# Altium footprint library CONN_W2B_JST.PcbLib: 130 footprints (part 9 of 9)
Each footprint in its own frame and in the unit in brackets; x right, y up, seen from the top. Pads: shape width x height; smd on the part's side, far side on the other; paste and mask are expansions set on the pad; w line width, h text height; cw(c..) or ccw(c..) is an arc to the next point about the centre after c.
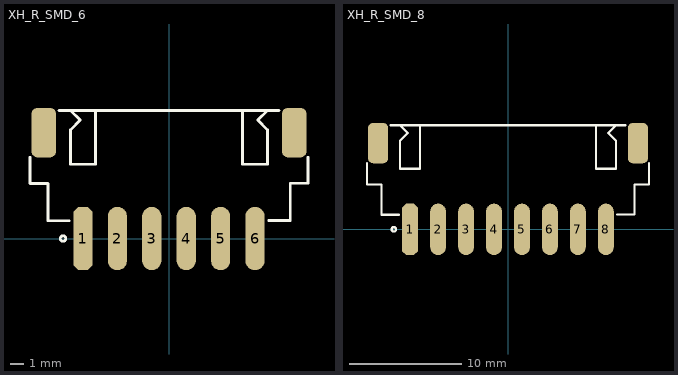
[diagram p8: the footprints below, top view; thin cyan lines are the x and y axes]

## XH_R_SMD_6 [mm] "JST-SxB-XH-SM4-TB pitch: 2.5mm, 3A/250v, Righ Angle (Side Entry), SMD"
pads (8):
  oct 1.4x4.6 smd: 1(-6.25,0)
  oval 1.4x4.6 smd: 2(-3.75,0) 3(-1.25,0) 4(1.25,0) 5(3.75,0) 6(6.25,0)
  rrect50% 1.8x3.6 smd: ""(-9.1,7.7) ""(9.1,7.7)
Top Overlay:
  circle w0.2: c-7.7,0 r0.2
  lines w0.2: -10.1,5.9 -10.1,4 -8.8,4 -8.8,1.3 -7.25,1.3 ; -8,9.3 8,9.3 ; -7.15,9.3 -6.45,8.6 -7.15,7.9 ; -5.35,9.3 -5.35,5.4 -7.15,5.4 -7.15,7.9 ; 5.35,9.3 5.35,5.4 7.15,5.4 7.15,7.9 ; 7.15,9.3 6.45,8.6 7.15,7.9 ; 7.257,1.314 8.807,1.314 8.807,4.014 10.107,4.014 10.107,5.914 ; -7.15,7.9 -7.15,7.9 ; 7.15,7.9 7.15,7.9
3D body "S6B-XH-SM4-TB.STEP": height 6, standoff 0, extent -10,-1 10,9.2

## XH_R_SMD_8 [mm] "JST-SxB-XH-SM4-TB pitch: 2.5mm, 3A/250v, Righ Angle (Side Entry), SMD"
height 6
pads (10):
  oct 1.4x4.6 smd: 1(-8.75,0)
  oval 1.4x4.6 smd: 2(-6.25,0) 3(-3.75,0) 4(-1.25,0) 5(1.25,0) 6(3.75,0) 7(6.25,0) 8(8.75,0)
  rrect50% 1.8x3.6 smd: ""(-11.6,7.7) ""(11.6,7.7)
Top Overlay:
  circle w0.2: c-10.2,0 r0.2
  lines w0.2: -12.6,5.9 -12.6,4 -11.3,4 -11.3,1.3 -9.75,1.3 ; -10.5,9.3 10.5,9.3 ; -9.65,9.3 -8.95,8.6 -9.65,7.9 ; -7.85,9.3 -7.85,5.4 -9.65,5.4 -9.65,7.9 ; 7.85,9.3 7.85,5.4 9.65,5.4 9.65,7.9 ; 9.65,9.3 8.95,8.6 9.65,7.9 ; 9.757,1.314 11.307,1.314 11.307,4.014 12.607,4.014 12.607,5.914 ; -9.65,7.9 -9.65,7.9 ; 9.65,7.9 9.65,7.9
3D body "S8B-XH-SM4-TB.STEP": height 6, standoff 0, extent -12.5,-1 12.5,9.2